# Altium footprint library Indruino.PcbLib: 383 footprints (part 3 of 24)
Each footprint in its own frame and in the unit in brackets; x right, y up, seen from the top. Pads: shape width x height; smd on the part's side, far side on the other; paste and mask are expansions set on the pad; w line width, h text height; cw(c..) or ccw(c..) is an arc to the next point about the centre after c.
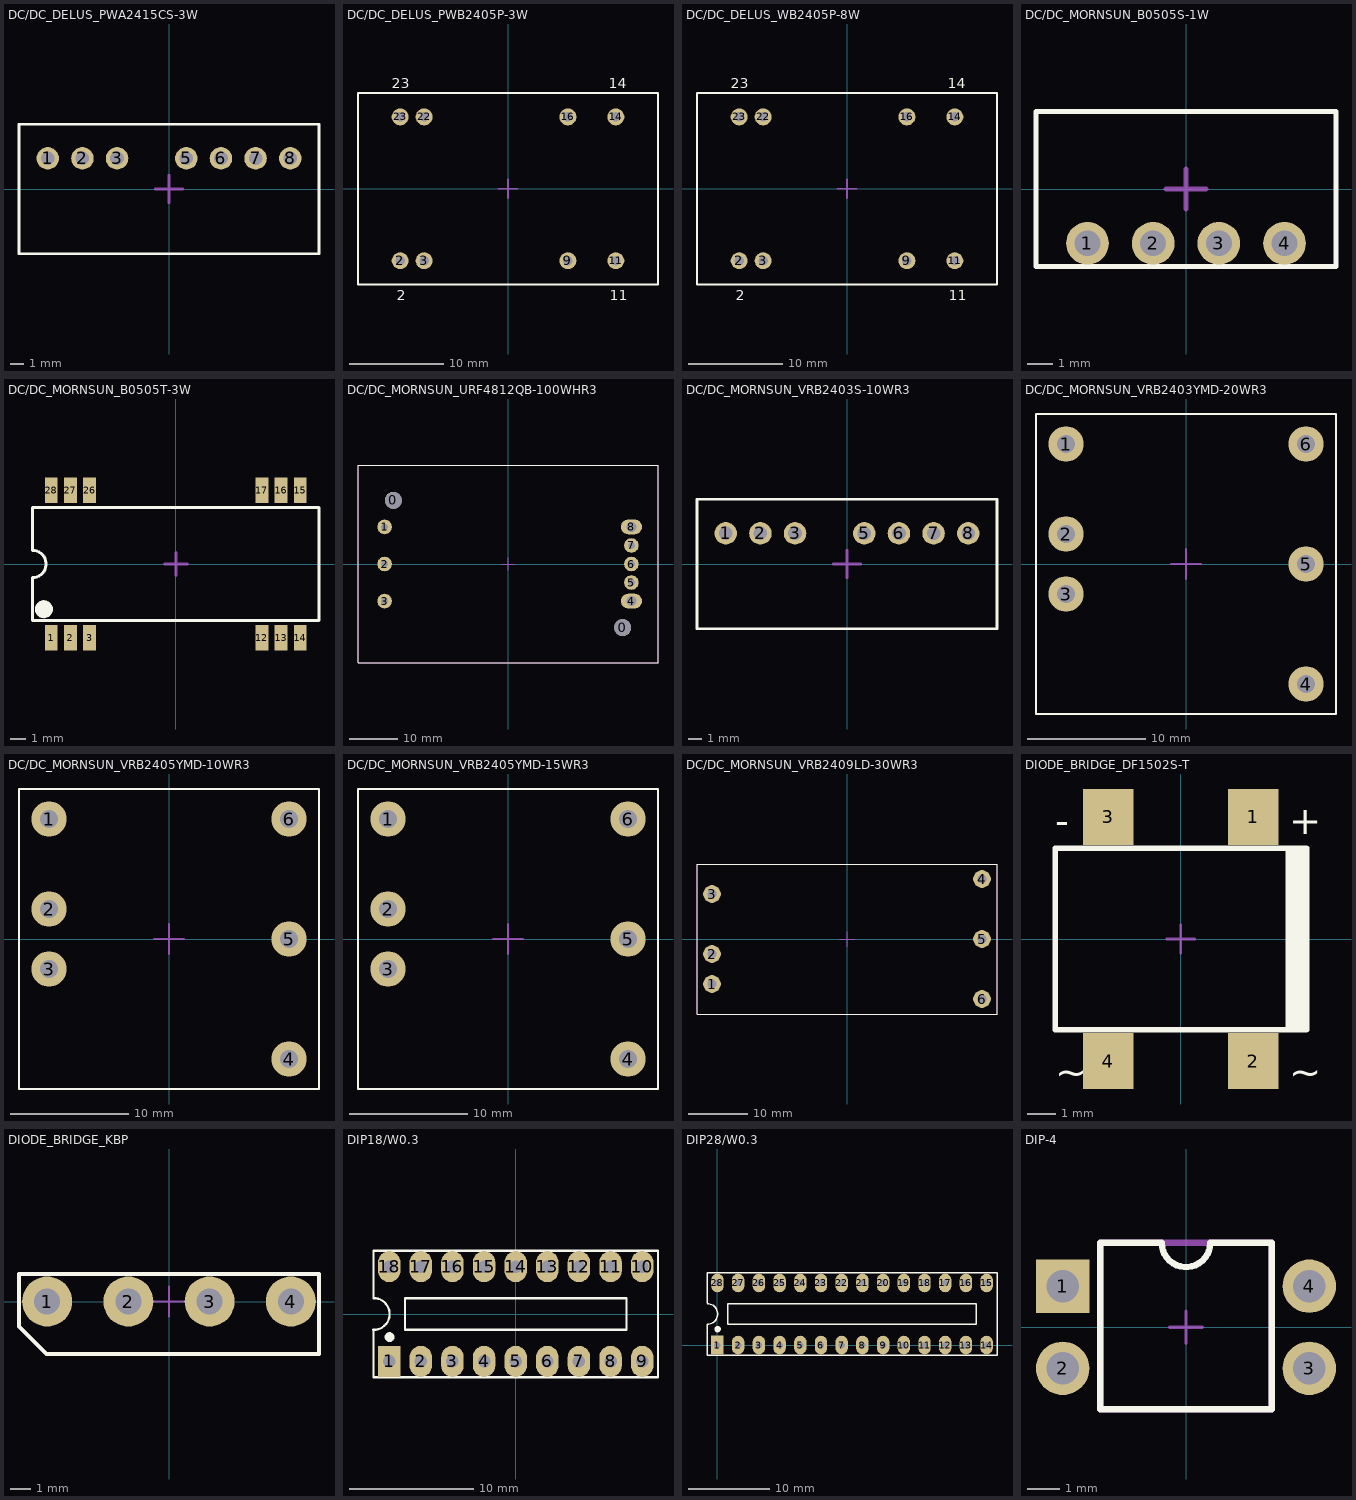
[diagram p2: the footprints below, top view; thin cyan lines are the x and y axes]

## DC/DC_DELUS_PWA2415CS-3W [mm] "Delus DC/DC Converter"
pads (7):
  round 1.65 hole 1: 1(-8.89,2.25) 2(-6.35,2.25) 3(-3.81,2.25) 5(1.27,2.25) 6(3.81,2.25) 7(6.35,2.25) 8(8.89,2.25)
Top Overlay:
  lines w0.2: -11,-4.75 11,-4.75 11,4.75 -11,4.75 -11,-4.75
Mechanical 15:
  lines w0.2: -1,0 1,0 ; 0,-1 0,1
3D body: height 12, standoff 0, extent -11,-4.75 11,4.75

## DC/DC_DELUS_PWB2405P-3W [mm] "Delus DC/DC Converter"
pads (8):
  round 1.8 hole 1: 2(-11.43,-7.62) 3(-8.89,-7.62) 9(6.35,-7.62) 11(11.43,-7.62) 14(11.43,7.62) 16(6.35,7.62) 22(-8.89,7.62) 23(-11.43,7.62)
Top Overlay:
  lines w0.2: -15.9,-10.15 -15.9,10.15 15.9,10.15 15.9,-10.15 -15.9,-10.15
  text "23" at -12.319,10.668 h1.1
  text "14" at 10.668,10.668 h1.1
  text "11" at 10.795,-11.811 h1.1
  text "2" at -11.811,-11.811 h1.1
Mechanical 15:
  lines w0.2: -1,0 1,0 ; 0,-1 0,1
3D body: height 9.45, standoff 0, extent -15.875,-10.16 15.875,10.16

## DC/DC_DELUS_WB2405P-8W [mm] "Delus DC/DC Converter"
pads (8):
  round 1.8 hole 1: 2(-11.43,-7.62) 3(-8.89,-7.62) 9(6.35,-7.62) 11(11.43,-7.62) 14(11.43,7.62) 16(6.35,7.62) 22(-8.89,7.62) 23(-11.43,7.62)
Top Overlay:
  lines w0.2: -15.9,-10.15 15.9,-10.15 15.9,10.15 -15.9,10.15 -15.9,-10.15
  text "2" at -11.811,-11.811 h1.1
  text "11" at 10.795,-11.811 h1.1
  text "14" at 10.668,10.668 h1.1
  text "23" at -12.319,10.668 h1.1
Mechanical 15:
  lines w0.2: -1,0 1,0 ; 0,-1 0,1
3D body "wb2405p.STEP": height 11.01, standoff 0, extent -15.9,-10.15 15.9,10.15

## DC/DC_MORNSUN_B0505S-1W [mm] "Mornsun DC/DC Converter"
pads (4):
  round 1.65 hole 1: 1(-3.81,-2.1) 2(-1.27,-2.1) 3(1.27,-2.1) 4(3.81,-2.1)
Top Overlay:
  lines w0.2: -5.8,-3 5.8,-3 5.8,3 -5.8,3 -5.8,-3
Mechanical 15:
  lines w0.2: -0.762,0 0.762,0 ; 0,-0.762 0,0.762
3D body: height 10.1, standoff 0, extent -5.8,-3 5.8,3

## DC/DC_MORNSUN_B0505T-3W [mm] "Mornsun DC/DC Converter"
pads (12):
  rect 0.85x1.7 smd: 1(-8.255,-4.88) 2(-6.985,-4.88) 3(-5.715,-4.88) 12(5.715,-4.88) 13(6.985,-4.88) 14(8.255,-4.88) 15(8.255,4.88) 16(6.985,4.88) 17(5.715,4.88) 26(-5.715,4.88) 27(-6.985,4.88) 28(-8.255,4.88)
Top Overlay:
  circle w0.2: c-8.75,-3 r0.5
  region: -8.75,-3.5 -8.849,-3.5 -9.033,-3.424 -9.174,-3.283 -9.25,-3.099 -9.25,-3 -9.25,-2.901 -9.174,-2.717 -9.033,-2.576 -8.849,-2.5 -8.75,-2.5 -8.651,-2.5 -8.467,-2.576 -8.326,-2.717 -8.25,-2.901 -8.25,-3 -8.25,-3.099 -8.326,-3.283 -8.467,-3.424 -8.651,-3.5
  lines w0.2: -9.5,-3.75 9.5,-3.75 9.5,3.75 -9.5,3.75 -9.5,0.9 cw(c-9.5,0) -9.5,-0.9 -9.5,-3.75
Mechanical 15:
  lines w0.2: -0.762,0 0.762,0 ; 0,-0.762 0,0.762
3D body: height 6.35, standoff 0, extent -9.5,-3.75 9.5,3.75

## DC/DC_MORNSUN_URF4812QB-100WHR3 [mm]
pads (10):
  round 3.5 hole 3.5: 0(-23.6,13.1) 0(23.6,-13.1)
  round 3 hole 1.5: 1(-25.4,7.62) 2(-25.4,0) 3(-25.4,-7.62) 5(25.4,-3.81) 6(25.4,0) 7(25.4,3.81)
  oval 4.4x3 hole 2: 4(25.4,-7.62) 8(25.4,7.62)
Top Overlay:
  lines w0.2: -30.861,-20.32 -30.861,20.32 30.861,20.32 30.861,-20.32 -30.861,-20.32
Mechanical 13:
  lines w0.2: -30.861,-20.32 30.861,-20.32 30.861,20.32 -30.861,20.32 -30.861,-20.32
Mechanical 15:
  lines w0.2: -1.27,0 1.27,0 ; 0,-1.27 0,1.27
3D body: height 25, standoff 0, extent -30.861,-20.32 30.861,20.32

## DC/DC_MORNSUN_VRB2403S-10WR3 [mm] "Delus DC/DC Converter"
pads (7):
  round 1.65 hole 1: 1(-8.89,2.25) 2(-6.35,2.25) 3(-3.81,2.25) 5(1.27,2.25) 6(3.81,2.25) 7(6.35,2.25) 8(8.89,2.25)
Top Overlay:
  lines w0.2: -11,-4.75 11,-4.75 11,4.75 -11,4.75 -11,-4.75
Mechanical 15:
  lines w0.2: -1,0 1,0 ; 0,-1 0,1
3D body: height 12, standoff 0, extent -11,-4.75 11,4.75

## DC/DC_MORNSUN_VRB2403YMD-20WR3 [mm]
pads (6):
  round 3 hole 1.5: 1(-10.16,10.16) 2(-10.16,2.54) 3(-10.16,-2.54) 4(10.16,-10.16) 5(10.16,0) 6(10.16,10.16)
Top Overlay:
  lines w0.2: -12.7,-12.7 12.7,-12.7 12.7,12.7 -12.7,12.7 -12.7,-12.7
Mechanical 13:
  lines w0.1: -12.7,-12.7 -12.7,12.7 12.7,12.7 12.7,-12.7 -12.7,-12.7
Mechanical 15:
  lines w0.2: -1.27,0 1.27,0 ; 0,-1.27 0,1.27
3D body "User Library-URA_YMD-10WR3.step": height 11.7, standoff -4.1, extent -12.7,-12.7 12.7,12.7

## DC/DC_MORNSUN_VRB2405YMD-10WR3 [mm]
pads (6):
  round 3 hole 1.5: 1(-10.16,10.16) 2(-10.16,2.54) 3(-10.16,-2.54) 4(10.16,-10.16) 5(10.16,0) 6(10.16,10.16)
Top Overlay:
  lines w0.2: -12.7,-12.7 -12.7,12.7 12.7,12.7 12.7,-12.7 -12.7,-12.7
Mechanical 13:
  lines w0.1: -12.7,-12.7 12.7,-12.7 12.7,12.7 -12.7,12.7 -12.7,-12.7
Mechanical 15:
  lines w0.2: -1.27,0 1.27,0 ; 0,-1.27 0,1.27
3D body "User Library-URA_YMD-10WR3.step": height 11.7, standoff -4.1, extent -12.7,-12.7 12.7,12.7

## DC/DC_MORNSUN_VRB2405YMD-15WR3 [mm]
pads (6):
  round 3 hole 1.5: 1(-10.16,10.16) 2(-10.16,2.54) 3(-10.16,-2.54) 4(10.16,-10.16) 5(10.16,0) 6(10.16,10.16)
Top Overlay:
  lines w0.2: -12.7,-12.7 -12.7,12.7 12.7,12.7 12.7,-12.7 -12.7,-12.7
Mechanical 13:
  lines w0.1: -12.7,-12.7 12.7,-12.7 12.7,12.7 -12.7,12.7 -12.7,-12.7
Mechanical 15:
  lines w0.2: -1.27,0 1.27,0 ; 0,-1.27 0,1.27
3D body "User Library-URA_YMD-10WR3.step": height 11.7, standoff -4.1, extent -12.7,-12.7 12.7,12.7

## DC/DC_MORNSUN_VRB2409LD-30WR3 [mm]
pads (6):
  round 3 hole 1.5: 1(-22.86,-7.62) 2(-22.86,-2.54) 3(-22.86,7.62) 4(22.86,10.16) 5(22.86,0) 6(22.86,-10.16)
Top Overlay:
  lines w0.2: -25.4,-12.7 25.4,-12.7 25.4,12.7 -25.4,12.7 -25.4,-12.7
Mechanical 13:
  lines w0.2: -25.4,-12.7 -25.4,12.7 25.4,12.7 25.4,-12.7 -25.4,-12.7
Mechanical 15:
  lines w0.2: -1.27,0 1.27,0 ; 0,-1.27 0,1.27
3D body: height 11.8, standoff 0, extent -25.4,-12.7 25.4,12.7

## DIODE_BRIDGE_DF1502S-T [mm] "https://www.digikey.com/product-detail/en/diodes-incorporated/DF1502S-T/DF1502SDICT-ND/350402"
pads (4):
  rect 1.8x2 smd: 1(2.6,4.37) 2(2.6,-4.37) 3(-2.6,4.37) 4(-2.6,-4.37)
Top Overlay:
  rectangle: 3.75,-3.25 4.5,3.25
  lines w0.2: -4.5,-3.25 -4.5,3.25 4.5,3.25 4.5,-3.25 -4.5,-3.25
  text "~" at 3.875,-5.25 h1
  text "~" at -4.5,-5.25 h1
  text "+" at 3.875,3.75 h1
  text "-" at -4.5,3.75 h1
Mechanical 15:
  lines w0.1: -0.5,0 0.5,0 ; 0,-0.5 0,0.5
3D body "User Library-Bridge rectifier DFS package-1.step": height 3.02, standoff 0, extent -4.4,-4.985 4.4,4.985

## DIODE_BRIDGE_KBP [mm]
pads (4):
  round 2.5 hole 1.3: 1(-6.09,0) 2(-2.03,0) 3(2.03,0) 4(6.09,0)
Top Overlay:
  lines w0.2: -7.5,-1.25 -6.125,-2.625 7.5,-2.625 7.5,1.375 -7.5,1.375 -7.5,-1.25
Mechanical 15:
  lines w0.1: -0.75,0 0.75,0 ; 0,-0.75 0,0.75
3D body "User Library-KBP2XX.STEP": height 13.1, standoff -10, extent -7.5,-2.575 7.5,1.325

## DIP18/W0.3 [mm]
pads (18):
  rect 1.8x2.5 hole 1: 1(-10.16,-3.81)
  oval 1.8x2.5 hole 1: 2(-7.62,-3.81) 3(-5.08,-3.81) 4(-2.54,-3.81) 5(0,-3.81) 6(2.54,-3.81) 7(5.08,-3.81) 8(7.62,-3.81) 9(10.16,-3.81) 10(10.16,3.81) 11(7.62,3.81) 12(5.08,3.81) 13(2.54,3.81) 14(0,3.81) 15(-2.54,3.81) 16(-5.08,3.81) 17(-7.62,3.81) 18(-10.16,3.81)
Top Overlay:
  circle w0.381: c-10.135,-1.854 r0.203
  lines w0.178: -11.44,-1.269 ccw(c-11.397,0) -11.43,1.27 ; -11.43,-1.27 -11.43,-5.08 11.43,-5.08 11.43,5.08 -11.43,5.08 -11.43,1.295 ; -8.89,-1.27 8.89,-1.27 8.89,1.27 -8.89,1.27 -8.89,-1.27

## DIP28/W0.3 [mil]
pads (28):
  rect 60x90 hole 31: 1(0,0)
  oval 60x90 hole 31: 2(100,0) 3(200,0) 4(300,0) 5(400,0) 6(500,0) 7(600,0) 8(700,0) 9(800,0) 10(900,0) 11(1000,0) 12(1100,0) 13(1200,0) 14(1300,0) 15(1300,300) 16(1200,300) 17(1100,300) 18(1000,300) 19(900,300) 20(800,300) 21(700,300) 22(600,300) 23(500,300) 24(400,300) 25(300,300) 26(200,300) 27(100,300) 28(0,300)
Top Overlay:
  circle w15: c1,77 r8
  lines w7: -50.38,100.05 ccw(c-48.68,150.02) -50,200 ; -50,100 -50,-50 1350,-50 1350,350 -50,350 -50,201 ; 50,100 1250,100 1250,200 50,200 50,100
3D body "SW3dPS-DIP28-300.STEP": height 200, standoff -98.03, extent -50,-10 1367.32,299.84

## DIP-4 [mm] "DIP, 4-Pin, Row Spacing 7.62 mm, Pitch 2.54 mm"
height 5.33
pads (4):
  rect 1.65x1.65 hole 1: 1(-3.81,1.27)
  round 1.65 hole 1: 2(-3.81,-1.27) 3(3.81,-1.27) 4(3.81,1.27)
Top Overlay:
  lines w0.2: -2.65,-2.54 2.65,-2.54 2.65,2.61 0.75,2.61 cw(c0,2.61) -0.75,2.61 -2.65,2.61 -2.65,-2.54
Mechanical 13:
  lines w0.2: -2.65,-2.54 2.65,-2.54 2.65,2.61 -2.65,2.61 -2.65,-2.54
Mechanical 15:
  lines w0.1: -0.5,0 0.5,0 ; 0,-0.5 0,0.5
3D body "User Library-DIP4-7_62-2_54.STEP": height 4.3, standoff -2.7, extent -3.94,-2.285 3.94,2.305